# Altium footprint library RNG_Footprints.PcbLib: 134 footprints (part 3 of 9)
Each footprint in its own frame and in the unit in brackets; x right, y up, seen from the top. Pads: shape width x height; smd on the part's side, far side on the other; paste and mask are expansions set on the pad; w line width, h text height; cw(c..) or ccw(c..) is an arc to the next point about the centre after c.
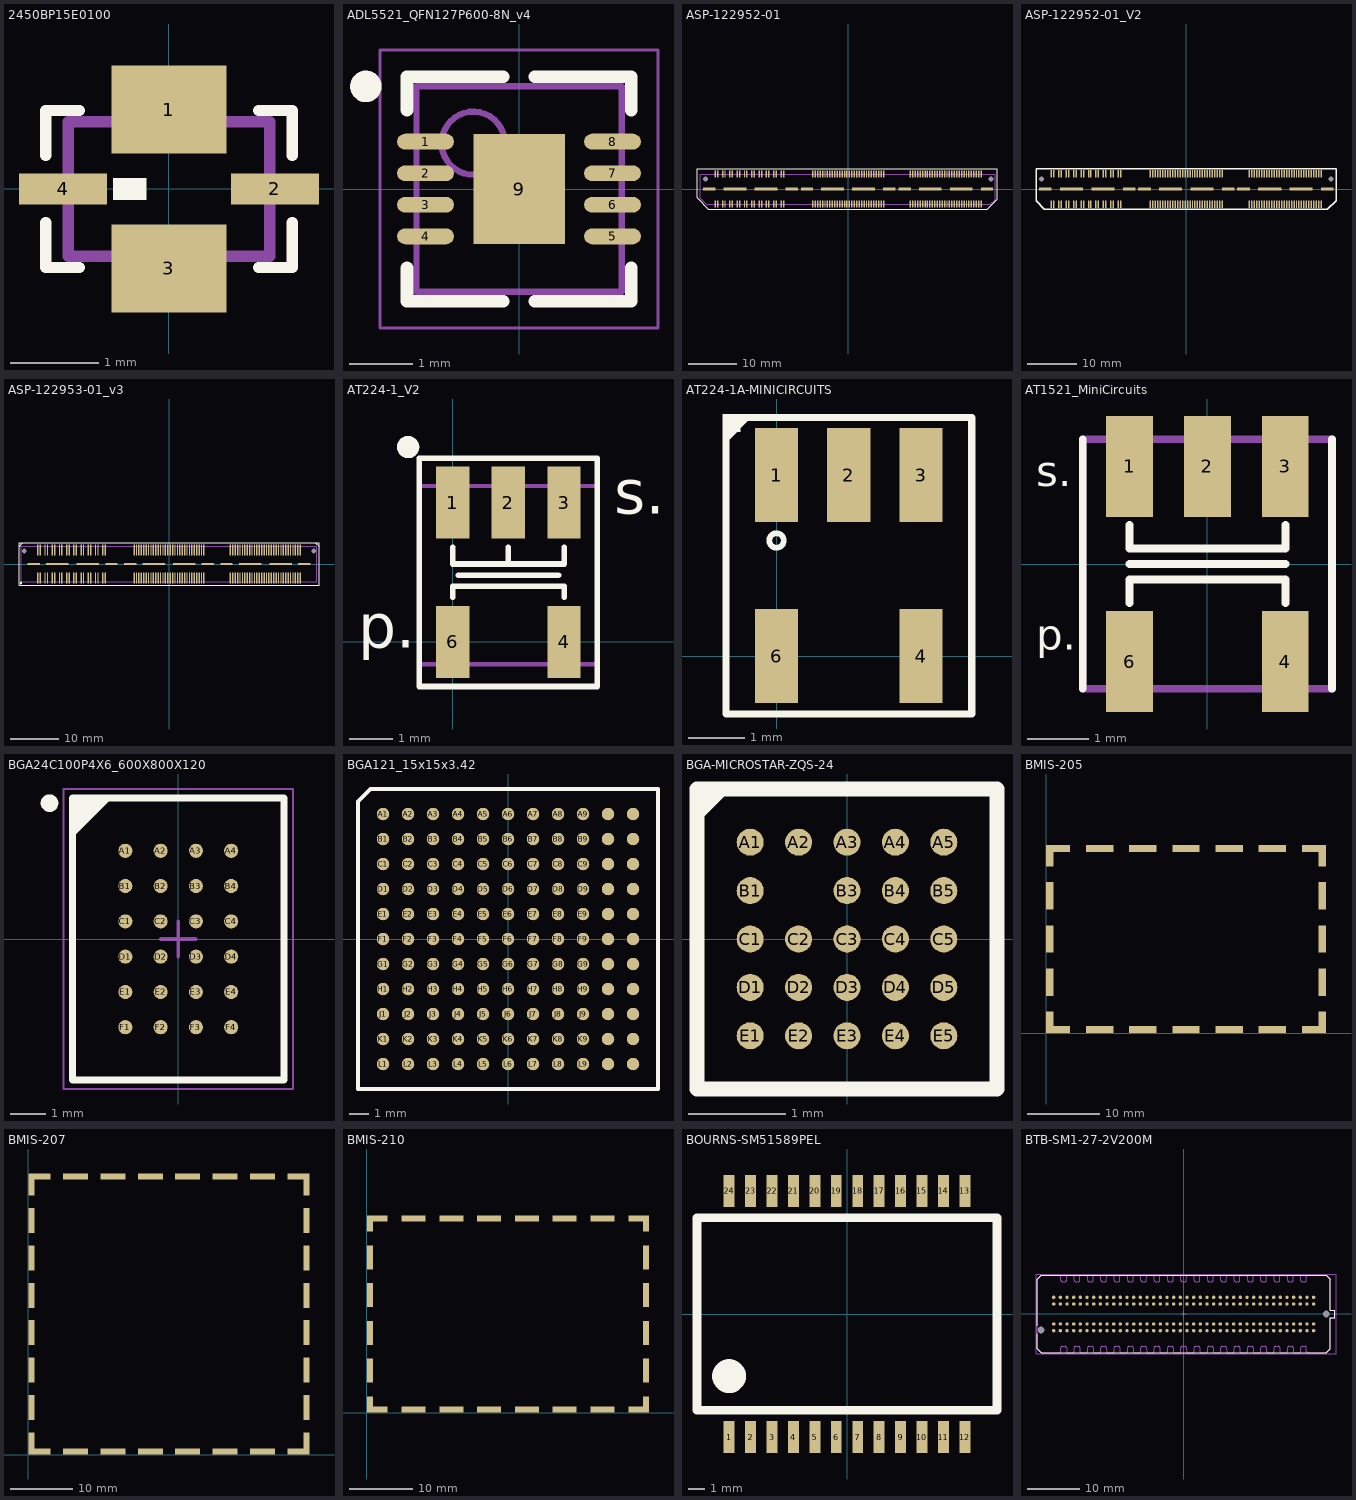
[diagram p2: the footprints below, top view; thin cyan lines are the x and y axes]

## 2450BP15E0100 [mm] "Johanson 2450 MHz Band Pass Filter"
height 0.66
pads (4):
  rect 1.3x1 smd mask+0.05: 1(0,0.9) 3(0,-0.9)
  rect 1x0.35 smd mask+0.05: 2(1.2,0) 4(-1.2,0)
Top Overlay:
  rectangle: -0.635,-0.127 -0.254,0.127
  lines w0.127: -1.397,-0.381 -1.397,-0.889 -1.016,-0.889 ; -1.397,0.381 -1.397,0.889 -1.016,0.889 ; 1.016,-0.889 1.397,-0.889 1.397,-0.381 ; 1.016,0.889 1.397,0.889 1.397,0.381
Mechanical 15:
  lines w0.127: -1.143,-0.762 1.143,-0.762 1.143,0.762 -1.143,0.762 -1.143,-0.762
3D body: height 0.66, standoff 0, extent -1.079,-0.673 1.079,0.673

## ADL5521_QFN127P600-8N_v4 [mm] "ADL5521 8-pin LFCSP"
height 0.9
pads (9):
  oval 0.9x0.25 smd: 1(-1.48,0.75) 2(-1.48,0.25) 3(-1.48,-0.25) 4(-1.48,-0.75) 5(1.48,-0.75) 6(1.48,-0.25) 7(1.48,0.25) 8(1.48,0.75)
  rect 1.45x1.74 smd: 9(0,0)
Top Overlay:
  circle w0.25: c-2.425,1.625 r0.125
  lines w0.2: -1.775,-1.25 -1.775,-1.775 -0.25,-1.775 ; -1.775,1.25 -1.775,1.775 -0.25,1.775 ; 0.25,-1.775 1.775,-1.775 1.775,-1.25 ; 0.25,1.775 1.775,1.775 1.775,1.25
Mechanical 13:
  circle w0.1: c-0.725,0.725 r0.5
  lines w0.1: -1.625,-1.625 1.625,-1.625 1.625,1.625 -1.625,1.625 -1.625,-1.625
Mechanical 15:
  lines w0.05: -2.2,-2.2 2.2,-2.2 2.2,2.2 -2.2,2.2 -2.2,-2.2
  lines w0.1: -0.5,0 0.5,0 ; 0,-0.5 0,0.5
3D body: height 0.9, standoff 0.01, extent -1.625,-1.625 1.625,1.625

## ASP-122952-01 [mm] "Samtec HSMC Daughtercard Connector"
height 4.089
pads (174):
  rect 0.3x1.45 smd mask+0.05: 1(-27.25,3.09) 2(-27.25,-3.09) 3(-26.75,3.09) 4(-26.75,-3.09) 5(-25.75,3.09) 6(-25.75,-3.09) 7(-25.25,3.09) 8(-25.25,-3.09) 9(-24.25,3.09) 10(-24.25,-3.09) 11(-23.75,3.09) 12(-23.75,-3.09) 13(-22.75,3.09) 14(-22.75,-3.09) 15(-22.25,3.09) 16(-22.25,-3.09) 17(-21.25,3.09) 18(-21.25,-3.09) 19(-20.75,3.09) 20(-20.75,-3.09) 21(-19.75,3.09) 22(-19.75,-3.09) 23(-19.25,3.09) 24(-19.25,-3.09) 25(-18.25,3.09) 26(-18.25,-3.09) 27(-17.75,3.09) 28(-17.75,-3.09) 29(-16.75,3.09) 30(-16.75,-3.09) 31(-16.25,3.09) 32(-16.25,-3.09) 33(-15.25,3.09) 34(-15.25,-3.09) 35(-14.75,3.09) 36(-14.75,-3.09) 37(-13.75,3.09) 38(-13.75,-3.09) 39(-13.25,3.09) 40(-13.25,-3.09) 41(-7.25,3.09) 42(-7.25,-3.09) 43(-6.75,3.09) 44(-6.75,-3.09) 45(-6.25,3.09) 46(-6.25,-3.09) 47(-5.75,3.09) 48(-5.75,-3.09) 49(-5.25,3.09) 50(-5.25,-3.09) 51(-4.75,3.09) 52(-4.75,-3.09) 53(-4.25,3.09) 54(-4.25,-3.09) 55(-3.75,3.09) 56(-3.75,-3.09) 57(-3.25,3.09) 58(-3.25,-3.09) 59(-2.75,3.09) 60(-2.75,-3.09) 61(-2.25,3.09) 62(-2.25,-3.09) 63(-1.75,3.09) 64(-1.75,-3.09) 65(-1.25,3.09) 66(-1.25,-3.09) 67(-0.75,3.09) 68(-0.75,-3.09) 69(-0.25,3.09) 70(-0.25,-3.09) 71(0.25,3.09) 72(0.25,-3.09) 73(0.75,3.09) 74(0.75,-3.09) 75(1.25,3.09) 76(1.25,-3.09) 77(1.75,3.09) 78(1.75,-3.09) 79(2.25,3.09) 80(2.25,-3.09) 81(2.75,3.09) 82(2.75,-3.09) 83(3.25,3.09) 84(3.25,-3.09) 85(3.75,3.09) 86(3.75,-3.09) 87(4.25,3.09) 88(4.25,-3.09) 89(4.75,3.09) 90(4.75,-3.09) 91(5.25,3.09) 92(5.25,-3.09) 93(5.75,3.09) 94(5.75,-3.09) 95(6.25,3.09) 96(6.25,-3.09) 97(6.75,3.09) 98(6.75,-3.09) 99(7.25,3.09) 100(7.25,-3.09) 101(12.75,3.09) 102(12.75,-3.09) 103(13.25,3.09) 104(13.25,-3.09) 105(13.75,3.09) 106(13.75,-3.09) 107(14.25,3.09) 108(14.25,-3.09) 109(14.75,3.09) 110(14.75,-3.09) 111(15.25,3.09) 112(15.25,-3.09) 113(15.75,3.09) 114(15.75,-3.09) 115(16.25,3.09) 116(16.25,-3.09) 117(16.75,3.09) 118(16.75,-3.09) 119(17.25,3.09) 120(17.25,-3.09) 121(17.75,3.09) 122(17.75,-3.09) 123(18.25,3.09) 124(18.25,-3.09) 125(18.75,3.09) 126(18.75,-3.09) 127(19.25,3.09) 128(19.25,-3.09) 129(19.75,3.09) 130(19.75,-3.09) 131(20.25,3.09) 132(20.25,-3.09) 133(20.75,3.09) 134(20.75,-3.09) 135(21.25,3.09) 136(21.25,-3.09) 137(21.75,3.09) 138(21.75,-3.09) 139(22.25,3.09) 140(22.25,-3.09) 141(22.75,3.09) 142(22.75,-3.09) 143(23.25,3.09) 144(23.25,-3.09) 145(23.75,3.09) 146(23.75,-3.09) 147(24.25,3.09) 148(24.25,-3.09) 149(24.75,3.09) 150(24.75,-3.09) 151(25.25,3.09) 152(25.25,-3.09) 153(25.75,3.09) 154(25.75,-3.09) 155(26.25,3.09) 156(26.25,-3.09) 157(26.75,3.09) 158(26.75,-3.09) 159(27.25,3.09) 160(27.25,-3.09)
  rect 2.54x0.64 smd mask+0.05: 161(-28.445,0) 164(-11.555,0) 165(-8.445,0) 168(8.445,0) 169(11.555,0) 172(28.445,0)
  rect 4.7x0.64 smd mask+0.05: 162(-23.175,0) 163(-16.825,0) 166(-3.175,0) 167(3.175,0) 170(16.825,0) 171(23.175,0)
  round 0 hole 1.02 unplated: 173(-29.24,2.03) 174(29.24,2.03)
Top Overlay:
  lines w0.254: -30.988,-1.778 -28.666,-4.1 28.501,-4.1 30.501,-2.1 30.501,4.1 -30.988,4.1 -30.988,-1.778
Mechanical 15:
  lines w0.127: -30.353,-1.905 -30.353,3.048 30.099,3.048 30.099,-2.159 29.083,-3.175 -29.083,-3.175 -30.353,-1.905
3D body: height 4.34, standoff 0, extent -30.264,-3.048 30.01,2.984

## ASP-122952-01_V2 [mm] "Samtec HSMC Daughtercard Connector"
height 4.089
pads (174):
  rect 0.3x1.45 smd mask+0.05: 1(-27.25,3.09) 2(-27.25,-3.09) 3(-26.75,3.09) 4(-26.75,-3.09) 5(-25.75,3.09) 6(-25.75,-3.09) 7(-25.25,3.09) 8(-25.25,-3.09) 9(-24.25,3.09) 10(-24.25,-3.09) 11(-23.75,3.09) 12(-23.75,-3.09) 13(-22.75,3.09) 14(-22.75,-3.09) 15(-22.25,3.09) 16(-22.25,-3.09) 17(-21.25,3.09) 18(-21.25,-3.09) 19(-20.75,3.09) 20(-20.75,-3.09) 21(-19.75,3.09) 22(-19.75,-3.09) 23(-19.25,3.09) 24(-19.25,-3.09) 25(-18.25,3.09) 26(-18.25,-3.09) 27(-17.75,3.09) 28(-17.75,-3.09) 29(-16.75,3.09) 30(-16.75,-3.09) 31(-16.25,3.09) 32(-16.25,-3.09) 33(-15.25,3.09) 34(-15.25,-3.09) 35(-14.75,3.09) 36(-14.75,-3.09) 37(-13.75,3.09) 38(-13.75,-3.09) 39(-13.25,3.09) 40(-13.25,-3.09) 41(-7.25,3.09) 42(-7.25,-3.09) 43(-6.75,3.09) 44(-6.75,-3.09) 45(-6.25,3.09) 46(-6.25,-3.09) 47(-5.75,3.09) 48(-5.75,-3.09) 49(-5.25,3.09) 50(-5.25,-3.09) 51(-4.75,3.09) 52(-4.75,-3.09) 53(-4.25,3.09) 54(-4.25,-3.09) 55(-3.75,3.09) 56(-3.75,-3.09) 57(-3.25,3.09) 58(-3.25,-3.09) 59(-2.75,3.09) 60(-2.75,-3.09) 61(-2.25,3.09) 62(-2.25,-3.09) 63(-1.75,3.09) 64(-1.75,-3.09) 65(-1.25,3.09) 66(-1.25,-3.09) 67(-0.75,3.09) 68(-0.75,-3.09) 69(-0.25,3.09) 70(-0.25,-3.09) 71(0.25,3.09) 72(0.25,-3.09) 73(0.75,3.09) 74(0.75,-3.09) 75(1.25,3.09) 76(1.25,-3.09) 77(1.75,3.09) 78(1.75,-3.09) 79(2.25,3.09) 80(2.25,-3.09) 81(2.75,3.09) 82(2.75,-3.09) 83(3.25,3.09) 84(3.25,-3.09) 85(3.75,3.09) 86(3.75,-3.09) 87(4.25,3.09) 88(4.25,-3.09) 89(4.75,3.09) 90(4.75,-3.09) 91(5.25,3.09) 92(5.25,-3.09) 93(5.75,3.09) 94(5.75,-3.09) 95(6.25,3.09) 96(6.25,-3.09) 97(6.75,3.09) 98(6.75,-3.09) 99(7.25,3.09) 100(7.25,-3.09) 101(12.75,3.09) 102(12.75,-3.09) 103(13.25,3.09) 104(13.25,-3.09) 105(13.75,3.09) 106(13.75,-3.09) 107(14.25,3.09) 108(14.25,-3.09) 109(14.75,3.09) 110(14.75,-3.09) 111(15.25,3.09) 112(15.25,-3.09) 113(15.75,3.09) 114(15.75,-3.09) 115(16.25,3.09) 116(16.25,-3.09) 117(16.75,3.09) 118(16.75,-3.09) 119(17.25,3.09) 120(17.25,-3.09) 121(17.75,3.09) 122(17.75,-3.09) 123(18.25,3.09) 124(18.25,-3.09) 125(18.75,3.09) 126(18.75,-3.09) 127(19.25,3.09) 128(19.25,-3.09) 129(19.75,3.09) 130(19.75,-3.09) 131(20.25,3.09) 132(20.25,-3.09) 133(20.75,3.09) 134(20.75,-3.09) 135(21.25,3.09) 136(21.25,-3.09) 137(21.75,3.09) 138(21.75,-3.09) 139(22.25,3.09) 140(22.25,-3.09) 141(22.75,3.09) 142(22.75,-3.09) 143(23.25,3.09) 144(23.25,-3.09) 145(23.75,3.09) 146(23.75,-3.09) 147(24.25,3.09) 148(24.25,-3.09) 149(24.75,3.09) 150(24.75,-3.09) 151(25.25,3.09) 152(25.25,-3.09) 153(25.75,3.09) 154(25.75,-3.09) 155(26.25,3.09) 156(26.25,-3.09) 157(26.75,3.09) 158(26.75,-3.09) 159(27.25,3.09) 160(27.25,-3.09)
  rect 2.54x0.64 smd mask+0.05: 161(-28.445,0) 164(-11.555,0) 165(-8.445,0) 168(8.445,0) 169(11.555,0) 172(28.445,0)
  rect 4.7x0.64 smd mask+0.05: 162(-23.175,0) 163(-16.825,0) 166(-3.175,0) 167(3.175,0) 170(16.825,0) 171(23.175,0)
  round 0 hole 1.02 unplated: 173(-29.24,2.03) 174(29.24,2.03)
Top Overlay:
  lines w0.254: -30.353,-2.413 -28.666,-4.1 28.501,-4.1 30.226,-2.375 30.226,4.1 -30.353,4.1 -30.353,-2.413
3D body "QTH-090-01-X-D-A.step": height 4.28, standoff -0.74, extent -30.002,-3.558 30.006,3.554

## ASP-122953-01_v3 [mil] "Samtec HSMC Motherboard Connector"
height 131
pads (174):
  rect 11x89.5 smd mask+2: 1(-1072.83,-112.75) 2(-1072.83,112.75) 3(-1053.15,-112.75) 4(-1053.15,112.75) 5(-1013.78,-112.75) 6(-1013.78,112.75) 7(-994.09,-112.75) 8(-994.09,112.75) 9(-954.72,-112.75) 10(-954.72,112.75) 11(-935.04,-112.75) 12(-935.04,112.75) 13(-895.67,-112.75) 14(-895.67,112.75) 15(-875.98,-112.75) 16(-875.98,112.75) 17(-836.61,-112.75) 18(-836.61,112.75) 19(-816.93,-112.75) 20(-816.93,112.75) 21(-777.56,-112.75) 22(-777.56,112.75) 23(-757.87,-112.75) 24(-757.87,112.75) 25(-718.5,-112.75) 26(-718.5,112.75) 27(-698.82,-112.75) 28(-698.82,112.75) 29(-659.45,-112.75) 30(-659.45,112.75) 31(-639.76,-112.75) 32(-639.76,112.75) 33(-600.39,-112.75) 34(-600.39,112.75) 35(-580.71,-112.75) 36(-580.71,112.75) 37(-541.34,-112.75) 38(-541.34,112.75) 39(-521.65,-112.75) 40(-521.65,112.75) 41(-285.43,-112.75) 42(-285.43,112.75) 43(-265.75,-112.75) 44(-265.75,112.75) 45(-246.06,-112.75) 46(-246.06,112.75) 47(-226.38,-112.75) 48(-226.38,112.75) 49(-206.69,-112.75) 50(-206.69,112.75) 51(-187.01,-112.75) 52(-187.01,112.75) 53(-167.32,-112.75) 54(-167.32,112.75) 55(-147.64,-112.75) 56(-147.64,112.75) 57(-127.95,-112.75) 58(-127.95,112.75) 59(-108.27,-112.75) 60(-108.27,112.75) 61(-88.58,-112.75) 62(-88.58,112.75) 63(-68.9,-112.75) 64(-68.9,112.75) 65(-49.21,-112.75) 66(-49.21,112.75) 67(-29.53,-112.75) 68(-29.53,112.75) 69(-9.84,-112.75) 70(-9.84,112.75) 71(9.84,-112.75) 72(9.84,112.75) 73(29.53,-112.75) 74(29.53,112.75) 75(49.21,-112.75) 76(49.21,112.75) 77(68.9,-112.75) 78(68.9,112.75) 79(88.58,-112.75) 80(88.58,112.75) 81(108.27,-112.75) 82(108.27,112.75) 83(127.95,-112.75) 84(127.95,112.75) 85(147.64,-112.75) 86(147.64,112.75) 87(167.32,-112.75) 88(167.32,112.75) 89(187.01,-112.75) 90(187.01,112.75) 91(206.69,-112.75) 92(206.69,112.75) 93(226.38,-112.75) 94(226.38,112.75) 95(246.06,-112.75) 96(246.06,112.75) 97(265.75,-112.75) 98(265.75,112.75) 99(285.43,-112.75) 100(285.43,112.75) 101(501.97,-112.75) 102(501.97,112.75) 103(521.65,-112.75) 104(521.65,112.75) 105(541.34,-112.75) 106(541.34,112.75) 107(561.02,-112.75) 108(561.02,112.75) 109(580.71,-112.75) 110(580.71,112.75) 111(600.39,-112.75) 112(600.39,112.75) 113(620.08,-112.75) 114(620.08,112.75) 115(639.76,-112.75) 116(639.76,112.75) 117(659.45,-112.75) 118(659.45,112.75) 119(679.13,-112.75) 120(679.13,112.75) 121(698.82,-112.75) 122(698.82,112.75) 123(718.5,-112.75) 124(718.5,112.75) 125(738.19,-112.75) 126(738.19,112.75) 127(757.87,-112.75) 128(757.87,112.75) 129(777.56,-112.75) 130(777.56,112.75) 131(797.24,-112.75) 132(797.24,112.75) 133(816.93,-112.75) 134(816.93,112.75) 135(836.61,-112.75) 136(836.61,112.75) 137(856.3,-112.75) 138(856.3,112.75) 139(875.98,-112.75) 140(875.98,112.75) 141(895.67,-112.75) 142(895.67,112.75) 143(915.35,-112.75) 144(915.35,112.75) 145(935.04,-112.75) 146(935.04,112.75) 147(954.72,-112.75) 148(954.72,112.75) 149(974.41,-112.75) 150(974.41,112.75) 151(994.09,-112.75) 152(994.09,112.75) 153(1013.78,-112.75) 154(1013.78,112.75) 155(1033.46,-112.75) 156(1033.46,112.75) 157(1053.15,-112.75) 158(1053.15,112.75) 159(1072.83,-112.75) 160(1072.83,112.75)
  rect 100x17 smd mask+2: 161(-1105.5,0) 164(-470.5,0) 165(-317.5,0) 168(317.5,0) 169(470.5,0) 172(1105.5,0)
  rect 185x17 smd mask+2: 162(-913,0) 163(-663,0) 166(-125,0) 167(125,0) 170(663,0) 171(913,0)
  round 0 hole 40 unplated: 173(-1184,105) 174(1184,105)
Top Overlay:
  circle w10: c-1210,-155 r5
  lines w10: -1226.5,140 -1226.5,141 -1195,172.5 ; 1200,172.5 1200,171.5 1226.5,145 ; -1226.5,-172.5 1226.5,-172.5 1226.5,172.5 -1226.5,172.5 -1226.5,-172.5
Mechanical 15:
  lines w5: -1210,-145 1210,-145 1210,145 -1210,145 -1210,-145
3D body "ASP-122953-01.step": height 128.48, standoff -29.02, extent -1206.24,-147.49 1206.26,147.51

## AT224-1_V2 [mm] "Mini-Circuits AT224-1 Case for TC4-14+"
height 4.06
pads (5):
  rect 0.76x1.65 smd: 1(0,3.18) 2(1.27,3.18) 3(2.54,3.18) 4(2.54,0) 6(0,0)
Top Overlay:
  circle w0.254: c-1.016,4.445 r0.127
  lines w0.127: 0,1.016 0,1.27 2.54,1.27 2.54,1.016 ; 0,2.159 0,1.778 2.54,1.778 2.54,2.159 ; 0.127,1.524 2.413,1.524 ; 1.27,1.778 1.27,2.159 ; -0.762,-1.016 -0.762,4.191 3.302,4.191 3.302,-1.016 -0.762,-1.016
  text "p." at -2.159,-0.127 h1
  text "s." at 3.683,2.921 h1
Mechanical 15:
  lines w0.1: -0.762,-0.508 3.302,-0.508 3.302,3.556 -0.762,3.556 -0.762,-0.508
3D body: height 4.06, standoff 0.18, extent -0.635,-0.381 3.175,3.429

## AT224-1A-MINICIRCUITS [mm] "Mini-Circuits AT224-1 Case for TC1-1-13MA+"
height 4.06
pads (5):
  rect 0.76x1.65 smd: 1(0,3.18) 2(1.27,3.18) 3(2.54,3.18) 4(2.54,0) 6(0,0)
Top Overlay:
  circle w0.102: c0,2.032 r0.127
  rectangle: -0.953,3.937 -0.635,4.255
  lines w0.1: -0.889,3.81 -0.508,4.191
  lines w0.127: -0.889,-1.016 -0.889,4.191 3.429,4.191 3.429,-1.016 -0.889,-1.016
3D body "SW3dPS-etc1-1-13.STEP": height 2.62, standoff 0.01, extent -0.635,-0.826 3.175,4

## AT1521_MiniCircuits [mm] "AT1521 Footprint for MiniCircuits Transformers"
height 4.06
pads (5):
  rect 0.76x1.65 smd paste-0.05 mask+0.05: 1(-1.27,1.59) 2(0,1.59) 3(1.27,1.59) 4(1.27,-1.59) 6(-1.27,-1.59)
Top Overlay:
  lines w0.127: -2.032,-2.032 -2.032,2.032 ; -1.27,-0.635 -1.27,-0.254 1.27,-0.254 1.27,-0.635 ; -1.27,0 1.27,0 ; -1.27,0.635 -1.27,0.254 1.27,0.254 1.27,0.635 ; 2.032,-2.032 2.032,2.032
  text "p." at -2.794,-1.397 h0.5
  text "s." at -2.794,1.27 h0.5
  text "." at -2.032,2.159 h0.5
Mechanical 15:
  lines w0.127: -2.032,-2.032 2.032,-2.032 2.032,2.032 -2.032,2.032 -2.032,-2.032
3D body: height 4.06, standoff 0, extent -1.905,-1.905 1.905,1.905

## BGA24C100P4X6_600X800X120 [mm] "BGA, 24-Leads, Body 6.00x8.00mmx1.20mm, Pitch 1.00mm"
height 1.2
pads (24):
  round 0.4 smd: A1(-1.5,2.5) A2(-0.5,2.5) A3(0.5,2.5) A4(1.5,2.5) B1(-1.5,1.5) B2(-0.5,1.5) B3(0.5,1.5) B4(1.5,1.5) C1(-1.5,0.5) C2(-0.5,0.5) C3(0.5,0.5) C4(1.5,0.5) D1(-1.5,-0.5) D2(-0.5,-0.5) D3(0.5,-0.5) D4(1.5,-0.5) E1(-1.5,-1.5) E2(-0.5,-1.5) E3(0.5,-1.5) E4(1.5,-1.5) F1(-1.5,-2.5) F2(-0.5,-2.5) F3(0.5,-2.5) F4(1.5,-2.5)
Top Overlay:
  circle w0.25: c-3.65,3.85 r0.125
  region: -2,4 -3,3 -3,4
  lines w0.2: -3,3 -2,4 ; -3,-4 -3,4 3,4 3,-4 -3,-4
Mechanical 13:
  lines w0.1: -3,-4 -3,4 3,4 3,-4 -3,-4
Mechanical 15:
  lines w0.05: -3.25,-4.25 -3.25,4.25 3.25,4.25 3.25,-4.25 -3.25,-4.25
  lines w0.1: -0.5,0 0.5,0 ; 0,-0.5 0,0.5
3D body: height 1.2, standoff 0.25, extent -3,-4 3,4

## BGA121_15x15x3.42 [mm]
pads (121):
  round 0.635 smd: A1(-6.35,6.35) A2(-5.08,6.35) A3(-3.81,6.35) A4(-2.54,6.35) A5(-1.27,6.35) A6(0,6.35) A7(1.27,6.35) A8(2.54,6.35) A9(3.81,6.35) A10(5.08,6.35) A11(6.35,6.35) B1(-6.35,5.08) B2(-5.08,5.08) B3(-3.81,5.08) B4(-2.54,5.08) B5(-1.27,5.08) B6(0,5.08) B7(1.27,5.08) B8(2.54,5.08) B9(3.81,5.08) B10(5.08,5.08) B11(6.35,5.08) C1(-6.35,3.81) C2(-5.08,3.81) C3(-3.81,3.81) C4(-2.54,3.81) C5(-1.27,3.81) C6(0,3.81) C7(1.27,3.81) C8(2.54,3.81) C9(3.81,3.81) C10(5.08,3.81) C11(6.35,3.81) D1(-6.35,2.54) D2(-5.08,2.54) D3(-3.81,2.54) D4(-2.54,2.54) D5(-1.27,2.54) D6(0,2.54) D7(1.27,2.54) D8(2.54,2.54) D9(3.81,2.54) D10(5.08,2.54) D11(6.35,2.54) E1(-6.35,1.27) E2(-5.08,1.27) E3(-3.81,1.27) E4(-2.54,1.27) E5(-1.27,1.27) E6(0,1.27) E7(1.27,1.27) E8(2.54,1.27) E9(3.81,1.27) E10(5.08,1.27) E11(6.35,1.27) F1(-6.35,0) F2(-5.08,0) F3(-3.81,0) F4(-2.54,0) F5(-1.27,0) F6(0,0) F7(1.27,0) F8(2.54,0) F9(3.81,0) F10(5.08,0) F11(6.35,0) G1(-6.35,-1.27) G2(-5.08,-1.27) G3(-3.81,-1.27) G4(-2.54,-1.27) G5(-1.27,-1.27) G6(0,-1.27) G7(1.27,-1.27) G8(2.54,-1.27) G9(3.81,-1.27) G10(5.08,-1.27) G11(6.35,-1.27) H1(-6.35,-2.54) H2(-5.08,-2.54) H3(-3.81,-2.54) H4(-2.54,-2.54) H5(-1.27,-2.54) H6(0,-2.54) H7(1.27,-2.54) H8(2.54,-2.54) H9(3.81,-2.54) H10(5.08,-2.54) H11(6.35,-2.54) J1(-6.35,-3.81) J2(-5.08,-3.81) J3(-3.81,-3.81) J4(-2.54,-3.81) J5(-1.27,-3.81) J6(0,-3.81) J7(1.27,-3.81) J8(2.54,-3.81) J9(3.81,-3.81) J10(5.08,-3.81) J11(6.35,-3.81) K1(-6.35,-5.08) K2(-5.08,-5.08) K3(-3.81,-5.08) K4(-2.54,-5.08) K5(-1.27,-5.08) K6(0,-5.08) K7(1.27,-5.08) K8(2.54,-5.08) K9(3.81,-5.08) K10(5.08,-5.08) K11(6.35,-5.08) L1(-6.35,-6.35) L2(-5.08,-6.35) L3(-3.81,-6.35) L4(-2.54,-6.35) L5(-1.27,-6.35) L6(0,-6.35) L7(1.27,-6.35) L8(2.54,-6.35) L9(3.81,-6.35) L10(5.08,-6.35) L11(6.35,-6.35)
Top Overlay:
  lines w0.2: -7.62,-7.62 7.62,-7.62 7.62,7.62 -6.985,7.62 -7.62,6.985 -7.62,-7.62
3D body: height 3.42, standoff 0, extent -7.5,-7.5 7.5,7.5

## BGA-MICROSTAR-ZQS-24 [mil] "TI ZQS Package S-PBGA-N24 Plastic Ball Grid Array"
height 30.32
pads (24):
  round 11 smd: A1(-39.37,39.37) A2(-19.68,39.37) A3(0,39.37) A4(19.68,39.37) A5(39.37,39.37) B1(-39.37,19.68) B3(0,19.68) B4(19.68,19.68) B5(39.37,19.68) C1(-39.37,0) C2(-19.68,0) C3(0,0) C4(19.68,0) C5(39.37,0) D1(-39.37,-19.68) D2(-19.68,-19.68) D3(0,-19.68) D4(19.68,-19.68) D5(39.37,-19.68) E1(-39.37,-39.37) E2(-19.68,-39.37) E3(0,-39.37) E4(19.68,-39.37) E5(39.37,-39.37)
Top Overlay:
  lines w6: -61,51.16 -51.16,61 ; -61,-61 61,-61 61,61 -61,61 -61,-61
Mechanical 1:
  lines w0: -61,51.16 -51.16,61 ; -61,-61 61,-61 61,61 -61,61 -61,-61
Mechanical 15:
  lines w1.57: -5,0 5,0 ; 0,-5 0,5
3D body: height 30.32, standoff 9.84, extent -61.02,-61.02 61.02,61.02

## BMIS-205 [mm] "LairdTech EMI 2-part Shield Footprint 1.0 x 1.5 in"
height 6
pads (24):
  rect 1x3 smd paste-0.05 mask+0.05: GND(0.5,1.5) GND(0.5,24.7) GND(38.4,1.5) GND(38.4,24.7)
  rect 1x3.8 smd paste-0.05 mask+0.05: GND(0.5,7.1) GND(0.5,13.1) GND(0.5,19.1) GND(38.4,7.1) GND(38.4,13.1) GND(38.4,19.1)
  rect 3.35x1 smd paste-0.05 mask+0.05: GND(1.675,0.5) GND(1.675,25.7) GND(37.225,0.5) GND(37.225,25.7)
  rect 3.8x1 smd paste-0.05 mask+0.05: GND(7.45,0.5) GND(7.45,25.7) GND(13.45,0.5) GND(13.45,25.7) GND(19.45,0.5) GND(19.45,25.7) GND(25.45,0.5) GND(25.45,25.7) GND(31.45,0.5) GND(31.45,25.7)
3D body "Laird-BMI-S-205-F  AND  BMI-S-205-C.STEP": height 27.01, standoff 0.01, extent 0.076,0.076 38.786,26.086

## BMIS-207 [mm] "LairdTech EMI Shield 1.747x1.747x0.384 in"
height 9.754
pads (32):
  rect 1x3.59 smd paste-0.05 mask+0.05: GND(0.5,1.795) GND(0.5,43.385) GND(44.68,1.795) GND(44.68,43.385)
  rect 1x4 smd paste-0.05 mask+0.05: GND(0.5,7.59) GND(0.5,13.59) GND(0.5,19.59) GND(0.5,25.59) GND(0.5,31.59) GND(0.5,37.59) GND(44.68,7.59) GND(44.68,13.59) GND(44.68,19.59) GND(44.68,25.59) GND(44.68,31.59) GND(44.68,37.59)
  rect 3.59x1 smd paste-0.05 mask+0.05: GND(1.795,0.5) GND(1.795,44.68) GND(43.385,0.5) GND(43.385,44.68)
  rect 4x1 smd paste-0.05 mask+0.05: GND(7.59,0.5) GND(7.59,44.68) GND(13.59,0.5) GND(13.59,44.68) GND(19.59,0.5) GND(19.59,44.68) GND(25.59,0.5) GND(25.59,44.68) GND(31.59,0.5) GND(31.59,44.68) GND(37.59,0.5) GND(37.59,44.68)

## BMIS-210 [mm] "LairdTech EMI Shield 1.201x1.732x0.118 in"
height 3
pads (28):
  rect 1x2.55 smd paste-0.05 mask+0.05: GND(0.5,1.275) GND(0.5,30.025) GND(44.3,1.275) GND(44.3,30.025)
  rect 1x3.8 smd paste-0.05 mask+0.05: GND(0.5,6.65) GND(0.5,12.65) GND(0.5,18.65) GND(0.5,24.65) GND(44.3,6.65) GND(44.3,12.65) GND(44.3,18.65) GND(44.3,24.65)
  rect 3.3x1 smd paste-0.05 mask+0.05: GND(1.65,0.5) GND(1.65,30.8) GND(43.15,0.5) GND(43.15,30.8)
  rect 3.8x1 smd paste-0.05 mask+0.05: GND(7.4,0.5) GND(7.4,30.8) GND(13.4,0.5) GND(13.4,30.8) GND(19.4,0.5) GND(19.4,30.8) GND(25.4,0.5) GND(25.4,30.8) GND(31.4,0.5) GND(31.4,30.8) GND(37.4,0.5) GND(37.4,30.8)

## BOURNS-SM51589PEL [mm] "Bournes SM51589PEL LAN 10/100/1000 Base-T Transformer PoE Module"
height 6
pads (24):
  rect 0.64x1.9 smd: 1(-6.985,-7.3) 2(-5.715,-7.3) 3(-4.445,-7.3) 4(-3.175,-7.3) 5(-1.905,-7.3) 6(-0.635,-7.3) 7(0.635,-7.3) 8(1.905,-7.3) 9(3.175,-7.3) 10(4.445,-7.3) 11(5.715,-7.3) 12(6.985,-7.3) 13(6.985,7.3) 14(5.715,7.3) 15(4.445,7.3) 16(3.175,7.3) 17(1.905,7.3) 18(0.635,7.3) 19(-0.635,7.3) 20(-1.905,7.3) 21(-3.175,7.3) 22(-4.445,7.3) 23(-5.715,7.3) 24(-6.985,7.3)
Top Overlay:
  circle w1.5: c-6.985,-3.683 r0.254
  lines w0.508: -8.89,-5.715 -8.89,5.715 8.89,5.715 8.89,-5.715 -8.89,-5.715
3D body "SM51589PEL.stp": height 5.62, standoff -0.15, extent -9.075,-8.045 9.073,8.068

## BTB-SM1-27-2V200M [mm] "Board-to-Board Connector, Vertical, 10-Row, Pitch 1.27mm, 200-Position"
height 7.12
pads (162):
  round 0.64 smd mask+0.125: C1(24.765,3.175) C2(23.495,3.175) C3(22.225,3.175) C4(20.955,3.175) C5(19.685,3.175) C6(18.415,3.175) C7(17.145,3.175) C8(15.875,3.175) C9(14.605,3.175) C10(13.335,3.175) C11(12.065,3.175) C12(10.795,3.175) C13(9.525,3.175) C14(8.255,3.175) C15(6.985,3.175) C16(5.715,3.175) C17(4.445,3.175) C18(3.175,3.175) C19(1.905,3.175) C20(0.635,3.175) C21(-0.635,3.175) C22(-1.905,3.175) C23(-3.175,3.175) C24(-4.445,3.175) C25(-5.715,3.175) C26(-6.985,3.175) C27(-8.255,3.175) C28(-9.525,3.175) C29(-10.795,3.175) C30(-12.065,3.175) C31(-13.335,3.175) C32(-14.605,3.175) C33(-15.875,3.175) C34(-17.145,3.175) C35(-18.415,3.175) C36(-19.685,3.175) C37(-20.955,3.175) C38(-22.225,3.175) C39(-23.495,3.175) C40(-24.765,3.175) D1(24.765,1.905) D2(23.495,1.905) D3(22.225,1.905) D4(20.955,1.905) D5(19.685,1.905) D6(18.415,1.905) D7(17.145,1.905) D8(15.875,1.905) D9(14.605,1.905) D10(13.335,1.905) D11(12.065,1.905) D12(10.795,1.905) D13(9.525,1.905) D14(8.255,1.905) D15(6.985,1.905) D16(5.715,1.905) D17(4.445,1.905) D18(3.175,1.905) D19(1.905,1.905) D20(0.635,1.905) D21(-0.635,1.905) D22(-1.905,1.905) D23(-3.175,1.905) D24(-4.445,1.905) D25(-5.715,1.905) D26(-6.985,1.905) D27(-8.255,1.905) D28(-9.525,1.905) D29(-10.795,1.905) D30(-12.065,1.905) D31(-13.335,1.905) D32(-14.605,1.905) D33(-15.875,1.905) D34(-17.145,1.905) D35(-18.415,1.905) D36(-19.685,1.905) D37(-20.955,1.905) D38(-22.225,1.905) D39(-23.495,1.905) D40(-24.765,1.905) G1(24.765,-1.905) G2(23.495,-1.905) G3(22.225,-1.905) G4(20.955,-1.905) G5(19.685,-1.905) G6(18.415,-1.905) G7(17.145,-1.905) G8(15.875,-1.905) G9(14.605,-1.905) G10(13.335,-1.905) G11(12.065,-1.905) G12(10.795,-1.905) G13(9.525,-1.905) G14(8.255,-1.905) G15(6.985,-1.905) G16(5.715,-1.905) G17(4.445,-1.905) G18(3.175,-1.905) G19(1.905,-1.905) G20(0.635,-1.905) G21(-0.635,-1.905) G22(-1.905,-1.905) G23(-3.175,-1.905) G24(-4.445,-1.905) G25(-5.715,-1.905) G26(-6.985,-1.905) G27(-8.255,-1.905) G28(-9.525,-1.905) G29(-10.795,-1.905) G30(-12.065,-1.905) G31(-13.335,-1.905) G32(-14.605,-1.905) G33(-15.875,-1.905) G34(-17.145,-1.905) G35(-18.415,-1.905) G36(-19.685,-1.905) G37(-20.955,-1.905) G38(-22.225,-1.905) G39(-23.495,-1.905) G40(-24.765,-1.905) H1(24.765,-3.175) H2(23.495,-3.175) H3(22.225,-3.175) H4(20.955,-3.175) H5(19.685,-3.175) H6(18.415,-3.175) H7(17.145,-3.175) H8(15.875,-3.175) H9(14.605,-3.175) H10(13.335,-3.175) H11(12.065,-3.175) H12(10.795,-3.175) H13(9.525,-3.175) H14(8.255,-3.175) H15(6.985,-3.175) H16(5.715,-3.175) H17(4.445,-3.175) H18(3.175,-3.175) H19(1.905,-3.175) H20(0.635,-3.175) H21(-0.635,-3.175) H22(-1.905,-3.175) H23(-3.175,-3.175) H24(-4.445,-3.175) H25(-5.715,-3.175) H26(-6.985,-3.175) H27(-8.255,-3.175) H28(-9.525,-3.175) H29(-10.795,-3.175) H30(-12.065,-3.175) H31(-13.335,-3.175) H32(-14.605,-3.175) H33(-15.875,-3.175) H34(-17.145,-3.175) H35(-18.415,-3.175) H36(-19.685,-3.175) H37(-20.955,-3.175) H38(-22.225,-3.175) H39(-23.495,-3.175) H40(-24.765,-3.175)
  round 0.97 hole 1.27 unplated: MH1(-27.19,-3.05) MH2(27.19,0)
Top Overlay:
  lines w0.2: -27.888,-3.75 -27.888,-6.58 -27.126,-7.343 -23.647,-7.343 23.648,-7.343 27.128,-7.343 27.89,-6.58 27.89,-0.764 28.779,-0.764 28.779,0.76 27.89,0.76 27.89,6.577 27.128,7.339 23.648,7.339 -23.647,7.339 -27.126,7.339 -27.888,6.577 -27.888,-2.25
Mechanical 13:
  drawing of 324 lines, arcs and shapes, not listed
Mechanical 15:
  lines w0.1: -28.139,-7.593 29.029,-7.593 29.029,7.589 -28.139,7.589 -28.139,-7.589 ; -0.5,0 0.5,0 ; 0,-0.5 0,0.5
3D body: height 2, standoff -1.27, extent -27.63,-3.597 -26.751,-2.503
3D body: height 2, standoff 0.1, extent -27.889,-0.764 -26.492,0.762
3D body: height 2, standoff 0.1, extent -27.889,-6.583 -26.492,-5.692
3D body: height 2, standoff 0.1, extent -27.889,2.284 -26.492,3.808
3D body: height 2, standoff 0.1, extent -27.888,5.685 -26.491,6.576
3D body: height 2, standoff 0.1, extent 27.89,-0.764 28.779,0.76
3D body: height 6.32, standoff 6.2, extent -5.129,-5.129 5.129,5.129
3D body: height 7.21, standoff 0.84, extent -27.889,-4.574 -26.731,-3.05
3D body: height 7.21, standoff 0.84, extent -27.889,3.046 -26.731,4.57
3D body: height 7.21, standoff 0.84, extent 26.696,0.697 27.89,2.005
3D body: height 7.21, standoff 0.84, extent 26.696,-2.009 27.89,-0.701
3D body: height 6.2, standoff 0.84, extent 25.655,2.005 26.95,5.738
3D body: height 6.2, standoff 0.84, extent 25.655,-5.742 26.95,-2.009
3D body: height 6.2, standoff 0.84, extent -25.653,-0.662 26.29,0.658
3D body: height 6.2, standoff 0.84, extent -26.949,-3.202 26.95,-1.882
3D body: height 6.2, standoff 0.84, extent -26.949,4.418 26.95,5.738
3D body: height 6.2, standoff 0.84, extent -26.949,-5.742 26.95,-4.422
3D body: height 3.45, standoff 0.84, extent -27.889,-7.343 28.779,7.339
3D body: height 6.2, standoff 0.84, extent -26.949,1.878 26.95,3.198
3D body: height 6.2, standoff 0.84, extent 26.29,-1.882 27.89,2.005
3D body: height 6.2, standoff 0.84, extent -26.949,-1.882 -25.349,2.005
3D body: height 6.2, standoff 0.84, extent -26.949,2.005 -25.653,5.738
3D body: height 6.2, standoff 0.84, extent -26.949,-5.742 -25.653,-2.009
3D body: height 2, standoff 0.1, extent 26.493,-6.581 27.89,-5.69
3D body: height 2, standoff 0.1, extent 26.493,-3.812 27.89,-2.288
3D body: height 2, standoff 0.1, extent 26.493,2.284 27.89,3.808
3D body: height 2, standoff 0.1, extent 26.493,5.685 27.89,6.576
3D body: height 2, standoff 0.6, extent 26.493,-6.581 27.89,6.577
3D body: height 2, standoff 0.35, extent -27.889,-3.812 -26.492,-2.288
3D body: height 2, standoff 0.35, extent 26.493,-0.764 27.89,0.76
3D body: height 0.73, standoff -1.27, extent 26.636,-0.51 27.752,0.608